# Altium footprint library con-molex.PCBLIB: 368 footprints (part 5 of 26)
Each footprint in its own frame and in the unit in brackets; x right, y up, seen from the top. Pads: shape width x height; smd on the part's side, far side on the other; paste and mask are expansions set on the pad; w line width, h text height; cw(c..) or ccw(c..) is an arc to the next point about the centre after c.
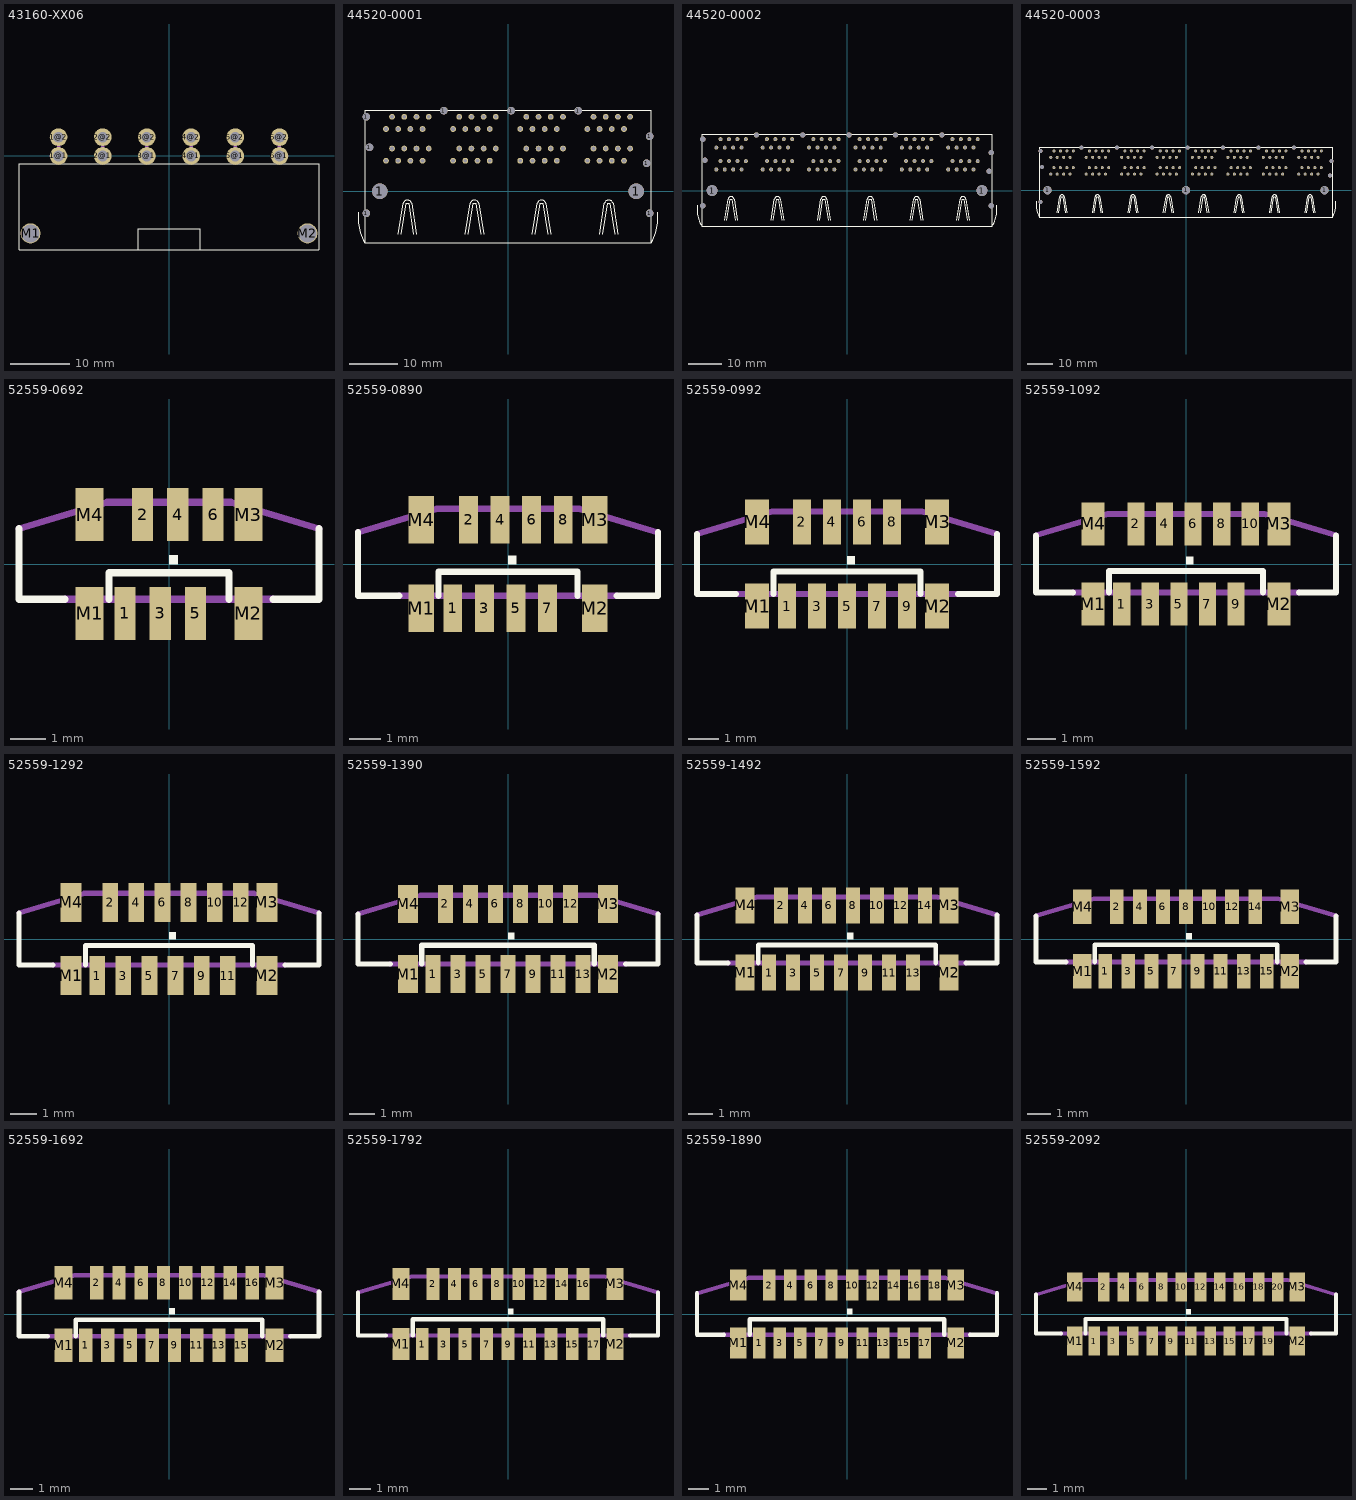
[diagram p4: the footprints below, top view; thin cyan lines are the x and y axes]

## 43160-XX06 [mm]
pads (14):
  round 3 hole 1.8: 1@1(-18.725,0) 1@2(-18.725,3.18) 2@1(-11.235,0) 2@2(-11.235,3.18) 3@1(-3.745,0) 3@2(-3.745,3.18) 4@1(3.745,0) 4@2(3.745,3.18) 5@1(11.235,0) 5@2(11.235,3.18) 6@1(18.725,0) 6@2(18.725,3.18)
  round 3.4 hole 3: M1(-23.475,-13.13) M2(23.475,-13.13)
Top Overlay:
  lines w0.203: -5.175,-15.8 -5.175,-12.325 5.175,-12.325 5.175,-15.85 ; -25.425,-15.885 -25.425,-1.325 25.425,-1.325 25.425,-15.885 -25.425,-15.885
Mechanical 16:
  lines w0.6: -18.725,-1.1 -18.725,3.745 ; -11.235,-1.1 -11.235,3.745 ; -3.745,-1.1 -3.745,3.745 ; 3.745,-1.1 3.745,3.745 ; 11.235,-1.1 11.235,3.745 ; 18.725,-1.1 18.725,3.745

## 44520-0001 [mil]
pads (75):
  round 62 hole 62: 1(-1160,-180) 1(-1160,610) 1(-1135,360) 1(-525,660) 1(25,660) 1(575,660) 1(1135,230) 1(1160,-180) 1(1160,450)
  round 128 hole 128: 1(-1050,0) 1(1050,0)
  round 47.25 hole 31.5: A1-1(-1000,250) A1-2(-950,350) A1-3(-900,250) A1-4(-850,350) A1-5(-800,250) A1-6(-750,350) A1-7(-700,250) A1-8(-650,350) A2-1(-650,610) A2-2(-700,510) A2-3(-750,610) A2-4(-800,510) A2-5(-850,610) A2-6(-900,510) A2-7(-950,610) A2-8(-1000,510) B1-1(-450,250) B1-2(-400,350) B1-3(-350,250) B1-4(-300,350) B1-5(-250,250) B1-6(-200,350) B1-7(-150,250) B1-8(-100,350) B2-1(-100,610) B2-2(-150,510) B2-3(-200,610) B2-4(-250,510) B2-5(-300,610) B2-6(-350,510) B2-7(-400,610) B2-8(-450,510) C1-1(100,250) C1-2(150,350) C1-3(200,250) C1-4(250,350) C1-5(300,250) C1-6(350,350) C1-7(400,250) C1-8(450,350) C2-1(450,610) C2-2(400,510) C2-3(350,610) C2-4(300,510) C2-5(250,610) C2-6(200,510) C2-7(150,610) C2-8(100,510) D1-1(650,250) D1-2(700,350) D1-3(750,250) D1-4(800,350) D1-5(850,250) D1-6(900,350) D1-7(950,250) D1-8(1000,350) D2-1(1000,610) D2-2(950,510) D2-3(900,610) D2-4(850,510) D2-5(800,610) D2-6(750,510) D2-7(700,610) D2-8(650,510)
Top Overlay:
  lines w8: -1227,-172 ccw(c-805.94,-213.16) -1175,-420 ; -900,-350 -860,-100 cw(c-825,-107.06) -790,-100 -750,-350 ; -875,-350 -835,-100 -815,-100 -775,-350 ; -350,-350 -310,-100 cw(c-275,-107.06) -240,-100 -200,-350 ; -325,-350 -285,-100 -265,-100 -225,-350 ; 200,-350 240,-100 cw(c275,-107.06) 310,-100 350,-350 ; 225,-350 265,-100 285,-100 325,-350 ; 750,-350 790,-100 cw(c825,-107.06) 860,-100 900,-350 ; 775,-350 815,-100 835,-100 875,-350 ; 1227,-172 cw(c783.5,-208.46) 1175,-420 ; -1175,-420 1175,-420 ; -1175,-420 -1175,660 1175,660 1175,-420

## 44520-0002 [mil]
pads (109):
  round 62 hole 62: 1(-1710,-180) 1(-1710,610) 1(-1685,360) 1(-1075,660) 1(-525,660) 1(25,660) 1(575,660) 1(1125,660) 1(1685,230) 1(1710,-180) 1(1710,450)
  round 128 hole 128: 1(-1600,0) 1(1600,0)
  round 47.25 hole 31.5: A1-1(-1550,250) A1-2(-1500,350) A1-3(-1450,250) A1-4(-1400,350) A1-5(-1350,250) A1-6(-1300,350) A1-7(-1250,250) A1-8(-1200,350) A2-1(-1200,610) A2-2(-1250,510) A2-3(-1300,610) A2-4(-1350,510) A2-5(-1400,610) A2-6(-1450,510) A2-7(-1500,610) A2-8(-1550,510) B1-1(-1000,250) B1-2(-950,350) B1-3(-900,250) B1-4(-850,350) B1-5(-800,250) B1-6(-750,350) B1-7(-700,250) B1-8(-650,350) B2-1(-650,610) B2-2(-700,510) B2-3(-750,610) B2-4(-800,510) B2-5(-850,610) B2-6(-900,510) B2-7(-950,610) B2-8(-1000,510) C1-1(-450,250) C1-2(-400,350) C1-3(-350,250) C1-4(-300,350) C1-5(-250,250) C1-6(-200,350) C1-7(-150,250) C1-8(-100,350) C2-1(-100,610) C2-2(-150,510) C2-3(-200,610) C2-4(-250,510) C2-5(-300,610) C2-6(-350,510) C2-7(-400,610) C2-8(-450,510) D1-1(100,250) D1-2(150,350) D1-3(200,250) D1-4(250,350) D1-5(300,250) D1-6(350,350) D1-7(400,250) D1-8(450,350) D2-1(450,610) D2-2(400,510) D2-3(350,610) D2-4(300,510) D2-5(250,610) D2-6(200,510) D2-7(150,610) D2-8(100,510) E1-1(650,250) E1-2(700,350) E1-3(750,250) E1-4(800,350) E1-5(850,250) E1-6(900,350) E1-7(950,250) E1-8(1000,350) E2-1(1000,610) E2-2(950,510) E2-3(900,610) E2-4(850,510) E2-5(800,610) E2-6(750,510) E2-7(700,610) E2-8(650,510) F1-1(1200,250) F1-2(1250,350) F1-3(1300,250) F1-4(1350,350) F1-5(1400,250) F1-6(1450,350) F1-7(1500,250) F1-8(1550,350) F2-1(1500,510) F2-2(1550,610) F2-3(1450,610) F2-4(1400,510) F2-5(1350,610) F2-6(1300,510) F2-7(1250,610) F2-8(1200,510)
Top Overlay:
  lines w8: -1777,-172 ccw(c-1355.94,-213.16) -1725,-420 ; -1450,-350 -1410,-100 cw(c-1375,-107.06) -1340,-100 -1300,-350 ; -1425,-350 -1385,-100 -1365,-100 -1325,-350 ; -900,-350 -860,-100 cw(c-825,-107.06) -790,-100 -750,-350 ; -875,-350 -835,-100 -815,-100 -775,-350 ; -350,-350 -310,-100 cw(c-275,-107.06) -240,-100 -200,-350 ; -325,-350 -285,-100 -265,-100 -225,-350 ; 200,-350 240,-100 cw(c275,-107.06) 310,-100 350,-350 ; 225,-350 265,-100 285,-100 325,-350 ; 750,-350 790,-100 cw(c825,-107.06) 860,-100 900,-350 ; 775,-350 815,-100 835,-100 875,-350 ; 1300,-350 1340,-100 cw(c1375,-107.06) 1410,-100 1450,-350 ; 1325,-350 1365,-100 1385,-100 1425,-350 ; 1777,-172 cw(c1333.5,-208.46) 1725,-420 ; -1725,-420 1725,-420 ; -1725,-420 -1725,660 1725,660 1725,-420

## 44520-0003 [mil]
pads (143):
  round 62 hole 62: 1(-2260,-180) 1(-2260,610) 1(-2235,360) 1(-1625,660) 1(-1075,660) 1(-525,660) 1(25,660) 1(575,660) 1(1125,660) 1(1675,660) 1(2235,230) 1(2260,450)
  round 128 hole 128: 1(-2150,0) 1(0,0) 1(2150,0)
  round 47.25 hole 31.5: A1-1(-2100,250) A1-2(-2050,350) A1-3(-2000,250) A1-4(-1950,350) A1-5(-1900,250) A1-6(-1850,350) A1-7(-1800,250) A1-8(-1750,350) A2-1(-1750,610) A2-2(-1800,510) A2-3(-1850,610) A2-4(-1900,510) A2-5(-1950,610) A2-6(-2000,510) A2-7(-2050,610) A2-8(-2100,510) B1-1(-1550,250) B1-2(-1500,350) B1-3(-1450,250) B1-4(-1400,350) B1-5(-1350,250) B1-6(-1300,350) B1-7(-1250,250) B1-8(-1200,350) B2-1(-1200,610) B2-2(-1250,510) B2-3(-1300,610) B2-4(-1350,510) B2-5(-1400,610) B2-6(-1450,510) B2-7(-1500,610) B2-8(-1550,510) C1-1(-1000,250) C1-2(-950,350) C1-3(-900,250) C1-4(-850,350) C1-5(-800,250) C1-6(-750,350) C1-7(-700,250) C1-8(-650,350) C2-1(-650,610) C2-2(-700,510) C2-3(-750,610) C2-4(-800,510) C2-5(-850,610) C2-6(-900,510) C2-7(-950,610) C2-8(-1000,510) D1-1(-450,250) D1-2(-400,350) D1-3(-350,250) D1-4(-300,350) D1-5(-250,250) D1-6(-200,350) D1-7(-150,250) D1-8(-100,350) D2-1(-100,610) D2-2(-150,510) D2-3(-200,610) D2-4(-250,510) D2-5(-300,610) D2-6(-350,510) D2-7(-400,610) D2-8(-450,510) E1-1(100,250) E1-2(150,350) E1-3(200,250) E1-4(250,350) E1-5(300,250) E1-6(350,350) E1-7(400,250) E1-8(450,350) E2-1(450,610) E2-2(400,510) E2-3(350,610) E2-4(300,510) E2-5(250,610) E2-6(200,510) E2-7(150,610) E2-8(100,510) F1-1(650,250) F1-2(700,350) F1-3(750,250) F1-4(800,350) F1-5(850,250) F1-6(900,350) F1-7(950,250) F1-8(1000,350) F2-1(950,510) F2-2(1000,610) F2-3(900,610) F2-4(850,510) F2-5(800,610) F2-6(750,510) F2-7(700,610) F2-8(650,510) G1-1(1200,250) G1-2(1250,350) G1-3(1300,250) G1-4(1350,350) G1-5(1400,250) G1-6(1450,350) G1-7(1500,250) G1-8(1550,350) G2-1(1550,610) G2-2(1500,510) G2-3(1450,610) G2-4(1400,510) G2-5(1350,610) G2-6(1300,510) G2-7(1250,610) G2-8(1200,510) H1-1(1750,250) H1-2(1800,350) H1-3(1850,250) H1-4(1900,350) H1-5(1950,250) H1-6(2000,350) H1-7(2050,250) H1-8(2100,350) H2-1(2100,610) H2-2(2050,510) H2-3(2000,610) H2-4(1950,510) H2-5(1900,610) H2-6(1850,510) H2-7(1800,610) H2-8(1750,510)
Top Overlay:
  lines w8: -2327,-172 ccw(c-1905.94,-213.16) -2275,-420 ; -2000,-350 -1960,-100 cw(c-1925,-107.06) -1890,-100 -1850,-350 ; -1975,-350 -1935,-100 -1915,-100 -1875,-350 ; -1450,-350 -1410,-100 cw(c-1375,-107.06) -1340,-100 -1300,-350 ; -1425,-350 -1385,-100 -1365,-100 -1325,-350 ; -900,-350 -860,-100 cw(c-825,-107.06) -790,-100 -750,-350 ; -875,-350 -835,-100 -815,-100 -775,-350 ; -350,-350 -310,-100 cw(c-275,-107.06) -240,-100 -200,-350 ; -325,-350 -285,-100 -265,-100 -225,-350 ; 200,-350 240,-100 cw(c275,-107.06) 310,-100 350,-350 ; 225,-350 265,-100 285,-100 325,-350 ; 750,-350 790,-100 cw(c825,-107.06) 860,-100 900,-350 ; 775,-350 815,-100 835,-100 875,-350 ; 1300,-350 1340,-100 cw(c1375,-107.06) 1410,-100 1450,-350 ; 1325,-350 1365,-100 1385,-100 1425,-350 ; 1850,-350 1890,-100 cw(c1925,-107.06) 1960,-100 2000,-350 ; 1875,-350 1915,-100 1935,-100 1975,-350 ; 2327,-172 cw(c1883.5,-208.46) 2275,-420 ; -2275,-420 2275,-420 ; -2275,-420 -2275,660 2275,660 2275,-420

## 52559-0692 [mil]
pads (10):
  rect 23.62x59.06 smd: 1(-49.21,-55.12) 2(-29.53,55.12) 3(-9.84,-55.12) 4(9.84,55.12) 5(29.53,-55.12) 6(49.21,55.12)
  rect 31.5x59.06 smd: M1(-88.58,-55.12) M2(88.58,-55.12) M3(88.58,55.12) M4(-88.58,55.12)
Top Overlay:
  region: 0,0 10,0 10,10 0,10
  lines w8: -167.32,39.37 -167.32,-39.37 -116.14,-39.37 ; -66.93,-39.37 -66.93,-9.84 66.93,-9.84 66.93,-39.37 ; 116.14,-39.37 167.32,-39.37 167.32,39.37
Mechanical 16:
  rectangle: -98.43,-61.02 -78.74,-43.31
  rectangle: -55.12,-61.02 -43.31,-43.31
  rectangle: -15.75,-61.02 -3.94,-43.31
  rectangle: 23.62,-61.02 35.43,-43.31
  rectangle: 78.74,-61.02 98.43,-43.31
  lines w8: -167.32,39.37 -68.9,68.9 68.9,68.9 167.32,39.37 ; -116.14,-39.37 116.14,-39.37

## 52559-0890 [mil]
pads (12):
  rect 23.62x59.06 smd: 1(-68.9,-55.12) 2(-49.21,55.12) 3(-29.53,-55.12) 4(-9.84,55.12) 5(9.84,-55.12) 6(29.53,55.12) 7(49.21,-55.12) 8(68.9,55.12)
  rect 31.5x59.06 smd: M1(-108.27,-55.12) M2(108.27,-55.12) M3(108.27,55.12) M4(-108.27,55.12)
Top Overlay:
  region: 0,0 10,0 10,10 0,10
  lines w8: -187.01,39.37 -187.01,-39.37 -135.83,-39.37 ; -86.61,-39.37 -86.61,-9.84 86.61,-9.84 86.61,-39.37 ; 135.83,-39.37 187.01,-39.37 187.01,39.37
Mechanical 16:
  rectangle: -118.11,-61.02 -98.43,-43.31
  rectangle: -74.8,-61.02 -62.99,-43.31
  rectangle: -35.43,-61.02 -23.62,-43.31
  rectangle: 3.94,-61.02 15.75,-43.31
  rectangle: 98.43,-61.02 118.11,-43.31
  rectangle: 43.31,-61.02 55.12,-43.31
  lines w8: -187.01,39.37 -88.58,68.9 88.58,68.9 187.01,39.37 ; -135.83,-39.37 135.83,-39.37

## 52559-0992 [mm]
pads (13):
  rect 0.6x1.5 smd: 1(-2,-1.4) 2(-1.5,1.4) 3(-1,-1.4) 4(-0.5,1.4) 5(0,-1.4) 6(0.5,1.4) 7(1,-1.4) 8(1.5,1.4) 9(2,-1.4)
  rect 0.8x1.5 smd: M1(-3,-1.4) M2(3,-1.4) M3(3,1.4) M4(-3,1.4)
Top Overlay:
  region: 0,0 0.254,0 0.254,0.254 0,0.254
  lines w0.203: -5,1 -5,-1 -3.7,-1 ; -2.45,-1 -2.45,-0.25 2.45,-0.25 2.45,-1 ; 3.7,-1 5,-1 5,1
Mechanical 16:
  rectangle: -3.25,-1.55 -2.75,-1.1
  rectangle: -2.15,-1.55 -1.85,-1.1
  rectangle: -1.15,-1.55 -0.85,-1.1
  rectangle: -0.15,-1.55 0.15,-1.1
  rectangle: 2.75,-1.55 3.25,-1.1
  rectangle: 0.85,-1.55 1.15,-1.1
  rectangle: 1.85,-1.55 2.15,-1.1
  lines w0.203: -5,1 -2.5,1.75 2.5,1.75 5,1 ; -3.7,-1 3.7,-1

## 52559-1092 [mil]
pads (14):
  rect 23.62x59.06 smd: 1(-88.58,-55.12) 2(-68.9,55.12) 3(-49.21,-55.12) 4(-29.53,55.12) 5(-9.84,-55.12) 6(9.84,55.12) 7(29.53,-55.12) 8(49.21,55.12) 9(68.9,-55.12) 10(88.58,55.12)
  rect 31.5x59.06 smd: M1(-127.95,-55.12) M2(127.95,-55.12) M3(127.95,55.12) M4(-127.95,55.12)
Top Overlay:
  region: 0,0 10,0 10,10 0,10
  lines w8: -206.69,39.37 -206.69,-39.37 -155.51,-39.37 ; -106.3,-39.37 -106.3,-9.84 106.3,-9.84 106.3,-39.37 ; 155.51,-39.37 206.69,-39.37 206.69,39.37
Mechanical 16:
  rectangle: -137.8,-61.02 -118.11,-43.31
  rectangle: -94.49,-61.02 -82.68,-43.31
  rectangle: -55.12,-61.02 -43.31,-43.31
  rectangle: -15.75,-61.02 -3.94,-43.31
  rectangle: 118.11,-61.02 137.8,-43.31
  rectangle: 23.62,-61.02 35.43,-43.31
  rectangle: 62.99,-61.02 74.8,-43.31
  lines w8: -206.69,39.37 -108.27,68.9 108.27,68.9 206.69,39.37 ; -155.51,-39.37 155.51,-39.37

## 52559-1292 [mil]
pads (16):
  rect 23.62x59.06 smd: 1(-108.27,-55.12) 2(-88.58,55.12) 3(-68.9,-55.12) 4(-49.21,55.12) 5(-29.53,-55.12) 6(-9.84,55.12) 7(9.84,-55.12) 8(29.53,55.12) 9(49.21,-55.12) 10(68.9,55.12) 11(88.58,-55.12) 12(108.27,55.12)
  rect 31.5x59.06 smd: M1(-147.64,-55.12) M2(147.64,-55.12) M3(147.64,55.12) M4(-147.64,55.12)
Top Overlay:
  region: 0,0 10,0 10,10 0,10
  lines w8: -226.38,39.37 -226.38,-39.37 -175.2,-39.37 ; -125.98,-39.37 -125.98,-9.84 125.98,-9.84 125.98,-39.37 ; 175.2,-39.37 226.38,-39.37 226.38,39.37
Mechanical 16:
  rectangle: -157.48,-61.02 -137.8,-43.31
  rectangle: -114.17,-61.02 -102.36,-43.31
  rectangle: -74.8,-61.02 -62.99,-43.31
  rectangle: -35.43,-61.02 -23.62,-43.31
  rectangle: 137.8,-61.02 157.48,-43.31
  rectangle: 3.94,-61.02 15.75,-43.31
  rectangle: 43.31,-61.02 55.12,-43.31
  rectangle: 82.68,-61.02 94.49,-43.31
  lines w8: -226.38,39.37 -127.95,68.9 127.95,68.9 226.38,39.37 ; -175.2,-39.37 175.2,-39.37

## 52559-1390 [mm]
pads (17):
  rect 0.6x1.5 smd: 1(-3,-1.4) 2(-2.5,1.4) 3(-2,-1.4) 4(-1.5,1.4) 5(-1,-1.4) 6(-0.5,1.4) 7(0,-1.4) 8(0.5,1.4) 9(1,-1.4) 10(1.5,1.4) 11(2,-1.4) 12(2.5,1.4) 13(3,-1.4)
  rect 0.8x1.5 smd: M1(-4,-1.4) M2(4,-1.4) M3(4,1.4) M4(-4,1.4)
Top Overlay:
  region: 0,0 0.254,0 0.254,0.254 0,0.254
  lines w0.203: -6,1 -6,-1 -4.7,-1 ; -3.45,-1 -3.45,-0.25 3.45,-0.25 3.45,-1 ; 4.7,-1 6,-1 6,1
Mechanical 16:
  rectangle: -4.25,-1.55 -3.75,-1.1
  rectangle: -3.15,-1.55 -2.85,-1.1
  rectangle: -2.15,-1.55 -1.85,-1.1
  rectangle: -1.15,-1.55 -0.85,-1.1
  rectangle: 3.75,-1.55 4.25,-1.1
  rectangle: -0.15,-1.55 0.15,-1.1
  rectangle: 0.85,-1.55 1.15,-1.1
  rectangle: 1.85,-1.55 2.15,-1.1
  rectangle: 2.85,-1.55 3.15,-1.1
  lines w0.203: -6,1 -3.5,1.75 3.5,1.75 6,1 ; -4.7,-1 4.7,-1

## 52559-1492 [mil]
pads (18):
  rect 23.62x59.06 smd: 1(-127.95,-55.12) 2(-108.27,55.12) 3(-88.58,-55.12) 4(-68.9,55.12) 5(-49.21,-55.12) 6(-29.53,55.12) 7(-9.84,-55.12) 8(9.84,55.12) 9(29.53,-55.12) 10(49.21,55.12) 11(68.9,-55.12) 12(88.58,55.12) 13(108.27,-55.12) 14(127.95,55.12)
  rect 31.5x59.06 smd: M1(-167.32,-55.12) M2(167.32,-55.12) M3(167.32,55.12) M4(-167.32,55.12)
Top Overlay:
  region: 0,0 10,0 10,10 0,10
  lines w8: -246.06,39.37 -246.06,-39.37 -194.88,-39.37 ; -145.67,-39.37 -145.67,-9.84 145.67,-9.84 145.67,-39.37 ; 194.88,-39.37 246.06,-39.37 246.06,39.37
Mechanical 16:
  rectangle: -177.17,-61.02 -157.48,-43.31
  rectangle: -133.86,-61.02 -122.05,-43.31
  rectangle: -94.49,-61.02 -82.68,-43.31
  rectangle: -55.12,-61.02 -43.31,-43.31
  rectangle: 157.48,-61.02 177.17,-43.31
  rectangle: -15.75,-61.02 -3.94,-43.31
  rectangle: 23.62,-61.02 35.43,-43.31
  rectangle: 62.99,-61.02 74.8,-43.31
  rectangle: 102.36,-61.02 114.17,-43.31
  lines w8: -246.06,39.37 -147.64,68.9 147.64,68.9 246.06,39.37 ; -194.88,-39.37 194.88,-39.37

## 52559-1592 [mm]
pads (19):
  rect 0.6x1.5 smd: 1(-3.5,-1.4) 2(-3,1.4) 3(-2.5,-1.4) 4(-2,1.4) 5(-1.5,-1.4) 6(-1,1.4) 7(-0.5,-1.4) 8(0,1.4) 9(0.5,-1.4) 10(1,1.4) 11(1.5,-1.4) 12(2,1.4) 13(2.5,-1.4) 14(3,1.4) 15(3.5,-1.4)
  rect 0.8x1.5 smd: M1(-4.5,-1.4) M2(4.5,-1.4) M3(4.5,1.4) M4(-4.5,1.4)
Top Overlay:
  region: 0,0 0.254,0 0.254,0.254 0,0.254
  lines w0.203: -6.5,1 -6.5,-1 -5.2,-1 ; -3.95,-1 -3.95,-0.25 3.95,-0.25 3.95,-1 ; 5.2,-1 6.5,-1 6.5,1
Mechanical 16:
  rectangle: -4.75,-1.55 -4.25,-1.1
  rectangle: -3.65,-1.55 -3.35,-1.1
  rectangle: -2.65,-1.55 -2.35,-1.1
  rectangle: -1.65,-1.55 -1.35,-1.1
  rectangle: 4.25,-1.55 4.75,-1.1
  rectangle: -0.65,-1.55 -0.35,-1.1
  rectangle: 0.35,-1.55 0.65,-1.1
  rectangle: 1.35,-1.55 1.65,-1.1
  rectangle: 2.35,-1.55 2.65,-1.1
  rectangle: 3.35,-1.55 3.65,-1.1
  lines w0.203: -6.5,1 -4,1.75 4,1.75 6.5,1 ; -5.2,-1 5.2,-1

## 52559-1692 [mil]
pads (20):
  rect 23.62x59.06 smd: 1(-147.64,-55.12) 2(-127.95,55.12) 3(-108.27,-55.12) 4(-88.58,55.12) 5(-68.9,-55.12) 6(-49.21,55.12) 7(-29.53,-55.12) 8(-9.84,55.12) 9(9.84,-55.12) 10(29.53,55.12) 11(49.21,-55.12) 12(68.9,55.12) 13(88.58,-55.12) 14(108.27,55.12) 15(127.95,-55.12) 16(147.64,55.12)
  rect 31.5x59.06 smd: M1(-187.01,-55.12) M2(187.01,-55.12) M3(187.01,55.12) M4(-187.01,55.12)
Top Overlay:
  region: 0,0 10,0 10,10 0,10
  lines w8: -265.75,39.37 -265.75,-39.37 -214.57,-39.37 ; -165.35,-39.37 -165.35,-9.84 165.35,-9.84 165.35,-39.37 ; 214.57,-39.37 265.75,-39.37 265.75,39.37
Mechanical 16:
  rectangle: -196.85,-61.02 -177.17,-43.31
  rectangle: -153.54,-61.02 -141.73,-43.31
  rectangle: -114.17,-61.02 -102.36,-43.31
  rectangle: -74.8,-61.02 -62.99,-43.31
  rectangle: 177.17,-61.02 196.85,-43.31
  rectangle: -35.43,-61.02 -23.62,-43.31
  rectangle: 3.94,-61.02 15.75,-43.31
  rectangle: 43.31,-61.02 55.12,-43.31
  rectangle: 82.68,-61.02 94.49,-43.31
  rectangle: 122.05,-61.02 133.86,-43.31
  lines w8: -265.75,39.37 -167.32,68.9 167.32,68.9 265.75,39.37 ; -214.57,-39.37 214.57,-39.37

## 52559-1792 [mm]
pads (21):
  rect 0.6x1.5 smd: 1(-4,-1.4) 2(-3.5,1.4) 3(-3,-1.4) 4(-2.5,1.4) 5(-2,-1.4) 6(-1.5,1.4) 7(-1,-1.4) 8(-0.5,1.4) 9(0,-1.4) 10(0.5,1.4) 11(1,-1.4) 12(1.5,1.4) 13(2,-1.4) 14(2.5,1.4) 15(3,-1.4) 16(3.5,1.4) 17(4,-1.4)
  rect 0.8x1.5 smd: M1(-5,-1.4) M2(5,-1.4) M3(5,1.4) M4(-5,1.4)
Top Overlay:
  region: 0,0 0.254,0 0.254,0.254 0,0.254
  lines w0.203: -7,1 -7,-1 -5.7,-1 ; -4.45,-1 -4.45,-0.25 4.45,-0.25 4.45,-1 ; 5.7,-1 7,-1 7,1
Mechanical 16:
  rectangle: -5.25,-1.55 -4.75,-1.1
  rectangle: -4.15,-1.55 -3.85,-1.1
  rectangle: -3.15,-1.55 -2.85,-1.1
  rectangle: -2.15,-1.55 -1.85,-1.1
  rectangle: 4.75,-1.55 5.25,-1.1
  rectangle: -1.15,-1.55 -0.85,-1.1
  rectangle: -0.15,-1.55 0.15,-1.1
  rectangle: 0.85,-1.55 1.15,-1.1
  rectangle: 1.85,-1.55 2.15,-1.1
  rectangle: 2.85,-1.55 3.15,-1.1
  rectangle: 3.85,-1.55 4.15,-1.1
  lines w0.203: -7,1 -4.5,1.75 4.5,1.75 7,1 ; -5.7,-1 5.7,-1

## 52559-1890 [mil]
pads (22):
  rect 23.62x59.06 smd: 1(-167.32,-55.12) 2(-147.64,55.12) 3(-127.95,-55.12) 4(-108.27,55.12) 5(-88.58,-55.12) 6(-68.9,55.12) 7(-49.21,-55.12) 8(-29.53,55.12) 9(-9.84,-55.12) 10(9.84,55.12) 11(29.53,-55.12) 12(49.21,55.12) 13(68.9,-55.12) 14(88.58,55.12) 15(108.27,-55.12) 16(127.95,55.12) 17(147.64,-55.12) 18(167.32,55.12)
  rect 31.5x59.06 smd: M1(-206.69,-55.12) M2(206.69,-55.12) M3(206.69,55.12) M4(-206.69,55.12)
Top Overlay:
  region: 0,0 10,0 10,10 0,10
  lines w8: -285.43,39.37 -285.43,-39.37 -234.25,-39.37 ; -185.04,-39.37 -185.04,-9.84 185.04,-9.84 185.04,-39.37 ; 234.25,-39.37 285.43,-39.37 285.43,39.37
Mechanical 16:
  rectangle: -216.54,-61.02 -196.85,-43.31
  rectangle: -173.23,-61.02 -161.42,-43.31
  rectangle: -133.86,-61.02 -122.05,-43.31
  rectangle: -94.49,-61.02 -82.68,-43.31
  rectangle: 196.85,-61.02 216.54,-43.31
  rectangle: -55.12,-61.02 -43.31,-43.31
  rectangle: -15.75,-61.02 -3.94,-43.31
  rectangle: 23.62,-61.02 35.43,-43.31
  rectangle: 62.99,-61.02 74.8,-43.31
  rectangle: 102.36,-61.02 114.17,-43.31
  rectangle: 141.73,-61.02 153.54,-43.31
  lines w8: -285.43,39.37 -187.01,68.9 187.01,68.9 285.43,39.37 ; -234.25,-39.37 234.25,-39.37

## 52559-2092 [mil]
pads (24):
  rect 23.62x59.06 smd: 1(-187.01,-55.12) 2(-167.32,55.12) 3(-147.64,-55.12) 4(-127.95,55.12) 5(-108.27,-55.12) 6(-88.58,55.12) 7(-68.9,-55.12) 8(-49.21,55.12) 9(-29.53,-55.12) 10(-9.84,55.12) 11(9.84,-55.12) 12(29.53,55.12) 13(49.21,-55.12) 14(68.9,55.12) 15(88.58,-55.12) 16(108.27,55.12) 17(127.95,-55.12) 18(147.64,55.12) 19(167.32,-55.12) 20(187.01,55.12)
  rect 31.5x59.06 smd: M1(-226.38,-55.12) M2(226.38,-55.12) M3(226.38,55.12) M4(-226.38,55.12)
Top Overlay:
  region: 0,0 10,0 10,10 0,10
  lines w8: -305.12,39.37 -305.12,-39.37 -253.94,-39.37 ; -204.72,-39.37 -204.72,-9.84 204.72,-9.84 204.72,-39.37 ; 253.94,-39.37 305.12,-39.37 305.12,39.37
Mechanical 16:
  rectangle: -236.22,-61.02 -216.54,-43.31
  rectangle: -192.91,-61.02 -181.1,-43.31
  rectangle: -153.54,-61.02 -141.73,-43.31
  rectangle: -114.17,-61.02 -102.36,-43.31
  rectangle: 216.54,-61.02 236.22,-43.31
  rectangle: -74.8,-61.02 -62.99,-43.31
  rectangle: -35.43,-61.02 -23.62,-43.31
  rectangle: 3.94,-61.02 15.75,-43.31
  rectangle: 43.31,-61.02 55.12,-43.31
  rectangle: 82.68,-61.02 94.49,-43.31
  rectangle: 122.05,-61.02 133.86,-43.31
  rectangle: 161.42,-61.02 173.23,-43.31
  lines w8: -305.12,39.37 -206.69,68.9 206.69,68.9 305.12,39.37 ; -253.94,-39.37 253.94,-39.37